# Altium footprint library standard.PcbLib: 229 footprints (part 11 of 15)
Each footprint in its own frame and in the unit in brackets; x right, y up, seen from the top. Pads: shape width x height; smd on the part's side, far side on the other; paste and mask are expansions set on the pad; w line width, h text height; cw(c..) or ccw(c..) is an arc to the next point about the centre after c.
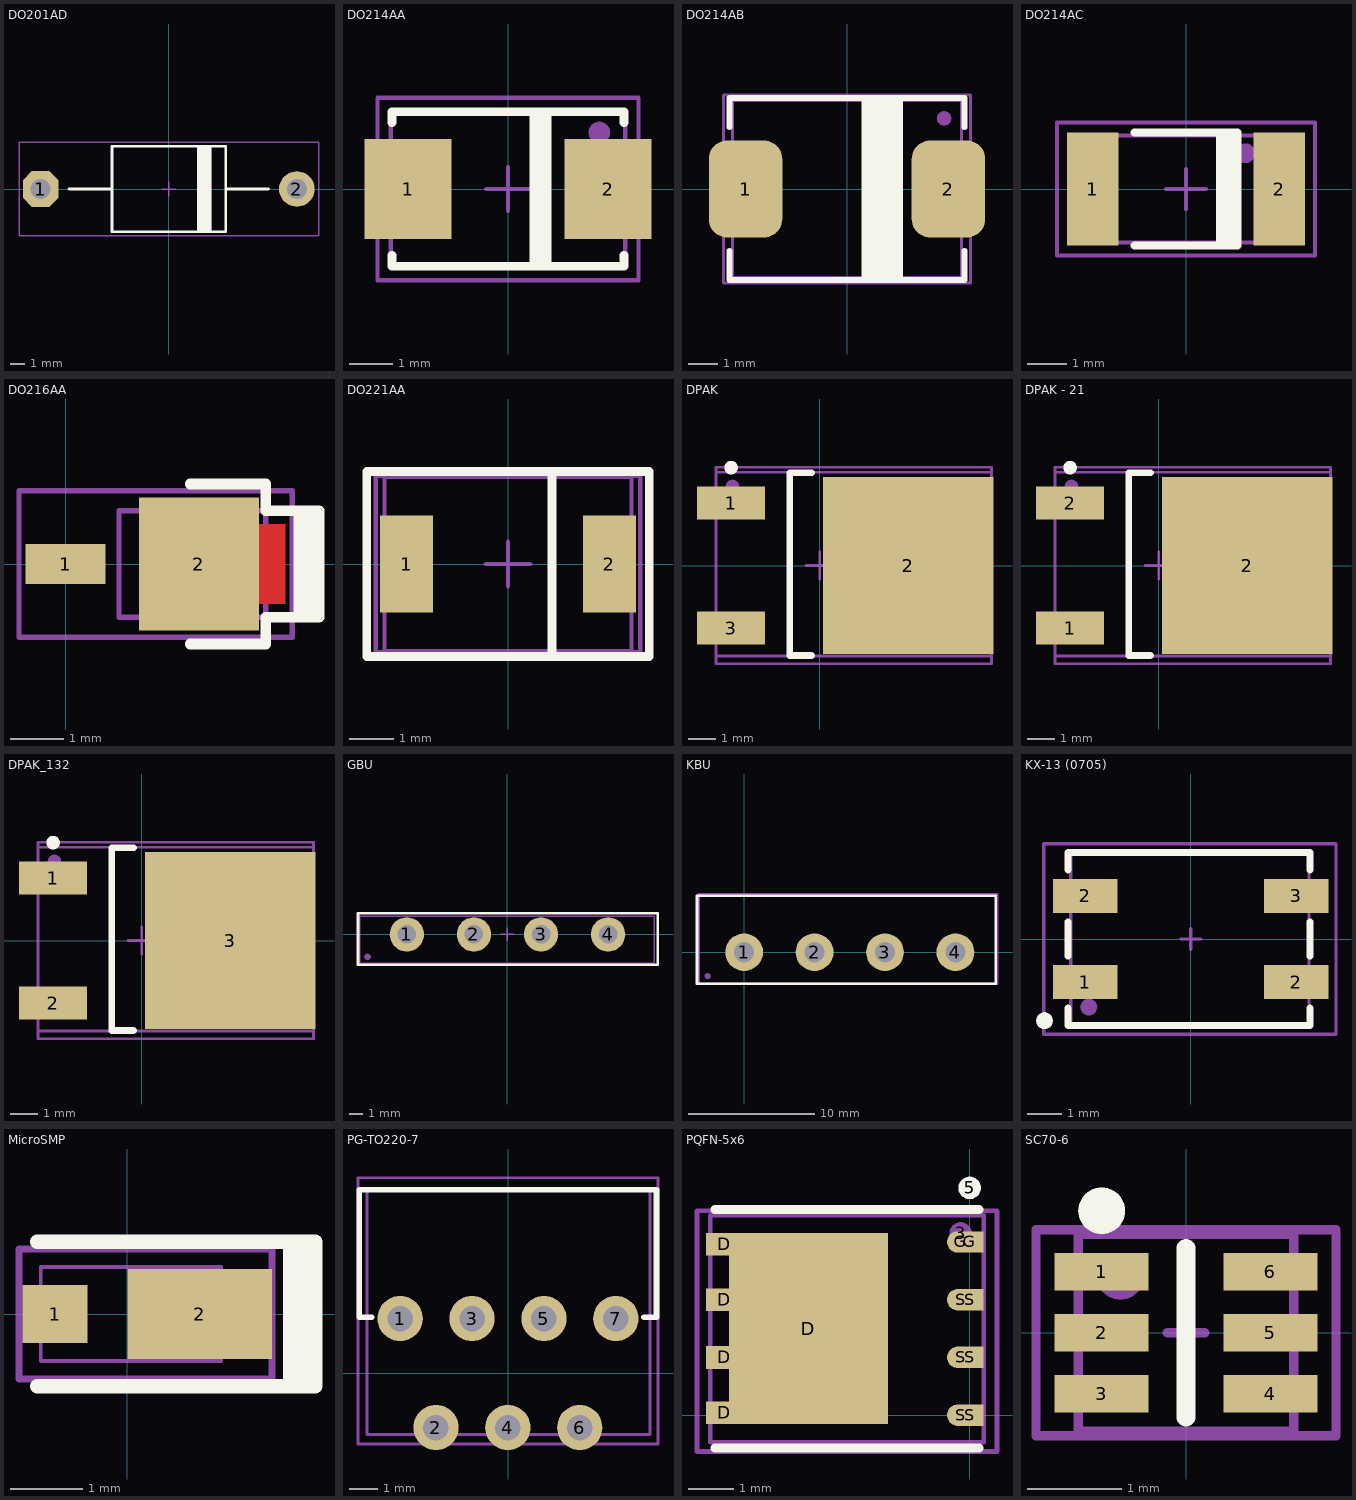
[diagram p10: the footprints below, top view; thin cyan lines are the x and y axes]

## DO201AD [mm] "Diode series 1N5400-1N5408"
height 5
pads (2):
  oct 2.5x2.5 hole 1.4: 1(-9,0)
  round 2.5 hole 1.4: 2(9,0)
Top Overlay:
  region: 2,3 2,-3 3,-3 3,3
  lines w0.2: -7,0 -4,0 ; 2,3 -4,3 ; 4,0 7,0 ; -4,3 -4,-3 4,-3 4,3 -4,3
Mechanical 1:
  region: 2,3 2,-3 3,-3 3,3
  lines w0.1: -7,0 -4,0 ; 2,3 -4,3 ; 4,0 7,0 ; -4,3 4,3 4,-3 -4,-3 -4,3
Mechanical 15:
  lines w0.1: -0.5,0 0.5,0 ; 0,-0.5 0,0.5 ; -10.524,-3.302 10.558,-3.302 10.558,3.302 -10.524,3.302 -10.524,-3.302
3D body "DO-201.STEP": height 6.8, standoff -2, extent -9.647,-2.85 9.647,2.75

## DO214AA [mm] "SMB"
height 4
pads (3):
  rect 2x2.3 smd: 1(-2.3,0) 2(2.3,0)
  round 0.5 on Mech1: ""(2.1,1.3)
Top Overlay:
  rectangle: 0.5,-1.778 1,1.778
  lines w0.2: -2.667,-1.524 -2.667,-1.778 2.667,-1.778 2.667,-1.524 ; -2.667,1.524 -2.667,1.778 2.667,1.778 2.667,1.524
Mechanical 1:
  lines w0.1: -2.7,-1.8 -2.7,1.8 2.7,1.8 2.7,-1.8 -2.7,-1.8
Mechanical 15:
  lines w0.1: -0.5,0 0.5,0 ; 0,-0.5 0,0.5 ; -3,-2.1 3,-2.1 3,2.1 -3,2.1 -3,-2.1
3D body "DO-214AA SMB.STEP": height 2.3, standoff 0, extent -2.7,-1.8 2.7,1.8

## DO214AB [mm] "SMC, Body 5.9x6.9mm"
height 2.5
pads (3):
  rrect50% 2.5x3.3 smd: 1(-3.45,0) 2(3.45,0)
  round 0.5 on Mech1: ""(3.3,2.4)
Top Overlay:
  rectangle: 0.5,-3 1.9,3.1
  lines w0.2: -4,-2.1 -4,-3.1 4,-3.1 4,-2.1 ; -4,2.1 -4,3.1 4,3.1 4,2.1
Mechanical 1:
  lines w0.1: -3.9,-3 3.9,-3 3.9,3 -3.9,3 -3.9,-3
Mechanical 15:
  lines w0.1: -4.2,-3.2 4.2,-3.2 4.2,3.2 -4.2,3.2 -4.2,-3.2
3D body "DO214AB.STEP": height 2.48, standoff 0.03, extent -3.9,-2.95 3.9,2.95

## DO214AC [mm] "SMA, MELF Diode, 2-Leads, Body 5,0x2,6mm, IPC Medium Density"
height 2.7
pads (3):
  rect 1.3x2.85 smd: 1(-2.35,0) 2(2.35,0)
  round 0.5 on Mech1: ""(1.5,0.9)
Top Overlay:
  rectangle: 0.75,-1.425 1.3,1.425
  lines w0.2: -1.3,-1.425 1.3,-1.425 1.3,1.425 -1.3,1.425
Mechanical 1:
  rectangle: 1.901,-1.35 2.6,1.35
  lines w0.1: -2.6,-1.35 -2.6,1.35 2.6,1.35 2.6,-1.35 -2.6,-1.35
Mechanical 15:
  lines w0.1: -0.5,0 0.5,0 ; 0,-0.5 0,0.5 ; -3.25,-1.675 -3.25,1.675 3.25,1.675 3.25,-1.675 -3.25,-1.675
3D body "DO-214AC(SMA).step": height 2.24, standoff -0.04, extent -2.743,-1.397 2.743,1.397

## DO216AA [mm] "Schottky Diode, 2-Leads, Body 2x2mm, 0.4W"
height 1
pads (3):
  rect 1.5x0.75 smd: 1(0,0)
  rect 2.25x2.5 smd: 2(2.5,0)
  round 0.5 on Mech1: ""(3.3,0.5)
Top Layer:
  rectangle: 3.625,-0.75 4.125,0.75
Top Overlay:
  rectangle: 4.275,-1 4.75,1
  lines w0.2: 2.337,-1.5 3.75,-1.5 3.75,-1 ; 2.337,1.5 3.75,1.5 3.75,1 ; 3.763,-1 4.725,-1 ; 3.763,1 4.725,1 ; 4.75,-1 4.75,1
Top Solder:
  rectangle: 3.725,-0.85 4.225,0.85
Mechanical 1:
  lines w0.1: 1,-1 1,1 3.75,1 3.75,0.75 4,0.5 4,-0.5 3.75,-0.75 3.75,-1 1,-1
Mechanical 15:
  lines w0.1: 1.85,0 2.85,0 ; 2.35,-0.5 2.35,0.5 ; -0.875,-1.375 4.25,-1.375 4.25,1.375 -0.875,1.375 -0.875,-1.375
3D body "DO216-AA.STEP": height 1.04, standoff 0.02, extent 0,-0.955 3.76,0.955

## DO221AA [mm]
pads (2):
  rect 1.2x2.2 smd: 1(-2.3,0) 2(2.3,0)
Top Overlay:
  lines w0.2: 1,-2.1 1,2.1 ; -3.2,-2.1 -3.2,2.1 3.2,2.1 3.2,-2.1 -3.2,-2.1
Mechanical 13:
  lines w0.1: 1,-1.975 1,1.975 ; -2.8,-1.975 -2.8,1.975 2.8,1.975 2.8,-1.975 -2.8,-1.975
Mechanical 15:
  lines w0.1: -0.5,0 0.5,0 ; 0,-0.5 0,0.5 ; -3,-2 3,-2 3,2 -3,2 -3,-2
3D body "DO-221AA.stp": height 1.1, standoff 0, extent -2.8,-1.975 2.8,1.975

## DPAK [mm] "D-Pak, Body 6,2x6,7mm"
height 2.4
pads (4):
  rect 2.5x1.2 smd: 1(-3.25,2.29) 3(-3.25,-2.29)
  rect 6.25x6.5 smd: 2(3.25,0)
  round 0.5 on Mech1: ""(-3.2,2.9)
Top Overlay:
  circle w0.25: c-3.25,3.59 r0.125
  lines w0.25: -0.3,-3.3 -1.1,-3.3 -1.1,3.4 -0.3,3.4
Mechanical 1:
  lines w0.1: -3.798,-3.317 6.302,-3.317 6.302,3.417 ; -3.798,-3.317 -3.798,-3.317 ; -3.798,-3.317 -3.798,3.417 6.302,3.417 ; 6.302,3.417 6.302,3.417
Mechanical 15:
  lines w0.1: -0.5,0 0.5,0 ; 0,-0.5 0,0.5 ; -3.8,-3.6 -3.8,3.6 6.3,3.6 6.3,-3.6 -3.8,-3.6
3D body "User Library-DPAK_TO-252AA.STEP": height 2.37, standoff -0.03, extent -3.798,-3.317 6.302,3.417

## DPAK - 21 [mm] "D-Pak, Body 6,2x6,7mm"
height 2.4
pads (4):
  rect 2.5x1.2 smd: 1(-3.25,-2.29) 2(-3.25,2.29)
  rect 6.25x6.5 smd: 2(3.25,0)
  round 0.5 on Mech1: ""(-3.2,2.9)
Top Overlay:
  circle w0.25: c-3.25,3.59 r0.125
  lines w0.25: -0.3,-3.3 -1.1,-3.3 -1.1,3.4 -0.3,3.4
Mechanical 1:
  lines w0.1: -3.798,-3.317 6.302,-3.317 6.302,3.417 ; -3.798,-3.317 -3.798,-3.317 ; -3.798,-3.317 -3.798,3.417 6.302,3.417 ; 6.302,3.417 6.302,3.417
Mechanical 15:
  lines w0.1: -0.5,0 0.5,0 ; 0,-0.5 0,0.5 ; -3.8,-3.6 -3.8,3.6 6.3,3.6 6.3,-3.6 -3.8,-3.6
3D body "User Library-DPAK_TO-252AA.STEP": height 2.37, standoff -0.03, extent -3.798,-3.317 6.302,3.417

## DPAK_132 [mm] "D-Pak, Body 6,2x6,7mm"
height 2.4
pads (4):
  rect 2.5x1.2 smd: 1(-3.25,2.29) 2(-3.25,-2.29)
  rect 6.25x6.5 smd: 3(3.25,0)
  round 0.5 on Mech1: ""(-3.2,2.9)
Top Overlay:
  circle w0.25: c-3.25,3.59 r0.125
  lines w0.25: -0.3,-3.3 -1.1,-3.3 -1.1,3.4 -0.3,3.4
Mechanical 1:
  lines w0.1: -3.798,-3.317 -3.798,3.417 6.302,3.417 ; -3.798,-3.317 -3.798,-3.317 ; -3.798,-3.317 6.302,-3.317 6.302,3.417 ; 6.302,3.417 6.302,3.417
Mechanical 15:
  lines w0.1: -0.5,0 0.5,0 ; 0,-0.5 0,0.5 ; -3.8,-3.6 6.3,-3.6 6.3,3.6 -3.8,3.6 -3.8,-3.6
3D body "User Library-DPAK_TO-252AA.STEP": height 2.37, standoff -0.03, extent -3.798,-3.317 6.302,3.417

## GBU [mm]
pads (5):
  round 2.6 hole 1.4: 1(-7.62,0) 2(-2.54,0) 3(2.54,0) 4(7.62,0)
  round 0.5 on Mech1: 2(-10.6,-1.7)
Top Overlay:
  lines w0.2: -11.32,-2.3 11.38,-2.3 11.38,1.6 -11.32,1.6 -11.32,-2.3
Mechanical 1:
  lines w0.1: -11.17,-2.2 11.13,-2.2 11.13,1.36 -11.17,1.36 -11.17,-2.2
Mechanical 15:
  lines w0.1: -0.5,0 0.5,0 ; 0,-0.5 0,0.5 ; -11.3,-2.3 11.4,-2.3 11.4,1.6 -11.3,1.6 -11.3,-2.3
3D body "User Library-GBU Vishay.STEP": height 25, standoff -11.55, extent -11.17,-2.2 11.13,1.36

## KBU [mm]
pads (5):
  round 3 hole 1.6: 1(0,0) 2(5.6,0) 3(11.2,0) 4(16.8,0)
  round 0.5 on Mech1: 3(-2.9,-1.9)
Top Overlay:
  lines w0.2: -3.75,-2.5 -3.75,4.5 20,4.5 20,-2.5 -3.75,-2.5
Mechanical 1:
  lines w0.2: -3.607,-2.5 -3.607,4.601 20.107,4.601 20.107,-2.5 -3.607,-2.5
Mechanical 15:
  lines w0.1: -3.7,-2.5 20.1,-2.5 20.1,4.6 -3.7,4.6 -3.7,-2.5
3D body "SW3dPS-KBU1010.STEP": height 26.96, standoff -20.74, extent -3.607,-2.5 20.107,4.601

## KX-13 (0705) [mm]
height 1.2
pads (6):
  rect 1.9x1 smd: 1(-3.1,-1.27) 2(-3.1,1.27) 2(3.1,-1.27) 3(3.1,1.27)
  round 0.5 on Top Overlay: ""(-4.3,-2.4)
  round 0.5 on Mech1: ""(-3,-2)
Top Overlay:
  lines w0.2: -3.608,-2.032 -3.608,-2.54 3.504,-2.54 3.504,-2.032 ; -3.608,-0.508 -3.608,0.508 ; -3.608,2.032 -3.608,2.54 3.504,2.54 3.504,2.032 ; 3.504,-0.508 3.504,0.508
Mechanical 1:
  lines w0.1: -3.526,-2.5 3.474,-2.5 3.474,2.5 -3.526,2.5 -3.526,-2.5
Mechanical 15:
  lines w0.1: -0.3,0 0.3,0 ; 0,-0.3 0,-0.2 0,0.3 ; -4.318,-2.794 -4.318,2.794 4.266,2.794 4.266,-2.794 -4.318,-2.794
3D body "KX-13 QSMD7.0x5.0x1.3.step": height 1.3, standoff 0, extent -3.526,-2.5 3.474,2.5

## MicroSMP [mm] "Schottky Diode, 2-Leads, Body 2,2x1,3mm, 0.4W"
height 0.7
pads (3):
  rect 0.9x0.8 smd: 1(-1,0)
  rect 2x1.25 smd: 2(1,0)
  round 0.5 on Mech1: ""(0.9,0.3)
Top Overlay:
  rectangle: 2.15,-1 2.65,0.9
  lines w0.2: -1.25,-1 2.6,-1 2.6,1 -1.25,1
Mechanical 1:
  lines w0.05: -1.2,-0.65 -1.2,0.65 1.3,0.65 1.3,-0.65 -1.2,-0.65
Mechanical 15:
  lines w0.1: 0.85,0 1.85,0 ; 1.35,-0.5 1.35,0.5 ; -1.5,-0.9 -1.5,0.9 2,0.9 2,-0.9 -1.5,-0.9
3D body "MicroSMP-1.STEP": height 0.71, standoff 0.03, extent -1.21,-0.65 1.29,0.65

## PG-TO220-7 [mm] "5-Lead Plastic TO-220"
height 20
pads (7):
  round 1.6 hole 0.9: 1(-3.81,1.925) 2(-2.545,-1.925) 3(-1.27,1.925) 4(-0.005,-1.925) 5(1.27,1.925) 6(2.535,-1.925) 7(3.81,1.925)
Top Overlay:
  lines w0.2: -4.818,1.975 -5.255,1.975 -5.255,6.475 5.245,6.475 5.245,1.975 4.807,1.975
Mechanical 1:
  lines w0.1: -4.98,-2.175 5.02,-2.175 5.02,6.475 -4.98,6.475 -4.98,-2.175
Mechanical 15:
  lines w0.1: -5.3,-2.5 5.3,-2.5 5.3,6.9 -5.3,6.9 -5.3,-2.5
3D body "PG-TO220-7-1.STEP": height 19.95, standoff -1.3, extent -4.98,-2.175 5.02,6.475

## PQFN-5x6 [mm]
pads (15):
  round 0.5 on Mech1: 3(-0.2,4)
  round 0.5 on Top Overlay: 5(0,5)
  rrect0% 0.8x0.5 smd: D(-5.4,0.05) D(-5.4,1.27) D(-5.4,2.54) D(-5.4,3.76)
  rect 3.5x4.21 smd: D(-3.55,1.905)
  oval 0.6x0.47 smd: G(-0.2,3.81) S(-0.2,0) S(-0.2,1.27) S(-0.2,2.54)
  rrect0% 0.6x0.47 smd: G(0,3.81) S(0,0) S(0,1.27) S(0,2.54)
Top Overlay:
  lines w0.2: -5.6,-0.725 0.2,-0.725 ; -5.6,4.525 0.2,4.525
Mechanical 1:
  lines w0.1: -5.71,-0.6 0.31,-0.6 0.31,4.4 -5.71,4.4 -5.71,-0.6
Mechanical 15:
  lines w0.1: -6,-0.8 0.6,-0.8 0.6,4.5 -6,4.5 -6,-0.8
3D body "User Library-PQFN 5x6.STEP": height 0.9, standoff 0, extent -5.71,-0.6 0.31,4.4

## SC70-6 [mm] "SOT23, 5-Leads, Body 2,90x2,80mm, Pitch 0,95mm, IPC Medium Density"
height 1.45
pads (8):
  rect 1x0.4 smd: 1(-0.9,0.65) 2(-0.9,0) 3(-0.9,-0.65) 4(0.9,-0.65) 5(0.9,0) 6(0.9,0.65)
  round 0.5 on Top Overlay: ""(-0.9,1.3)
  round 0.5 on Mech1: ""(-0.7,0.6)
Top Overlay:
  lines w0.2: 0,-0.9 0,0.9
Mechanical 1:
  lines w0.1: -1.15,-1.05 1.15,-1.05 1.15,1.05 -1.15,1.05 -1.15,-1.05
Mechanical 15:
  lines w0.1: -0.2,0 0.2,0 ; 0,-0.2 0,0.2 ; -1.6,-1.1 -1.6,1.1 1.6,1.1 1.6,-1.1 -1.6,-1.1
3D body "User Library-sot363.STEP": height 1, standoff 0, extent -1.15,-1.05 1.15,1.05